# Altium integrated library Connector-SIL-THP.IntLib: 464 symbols (part 2 of 2) (continued)
## SIL15S-2.54 (continued)
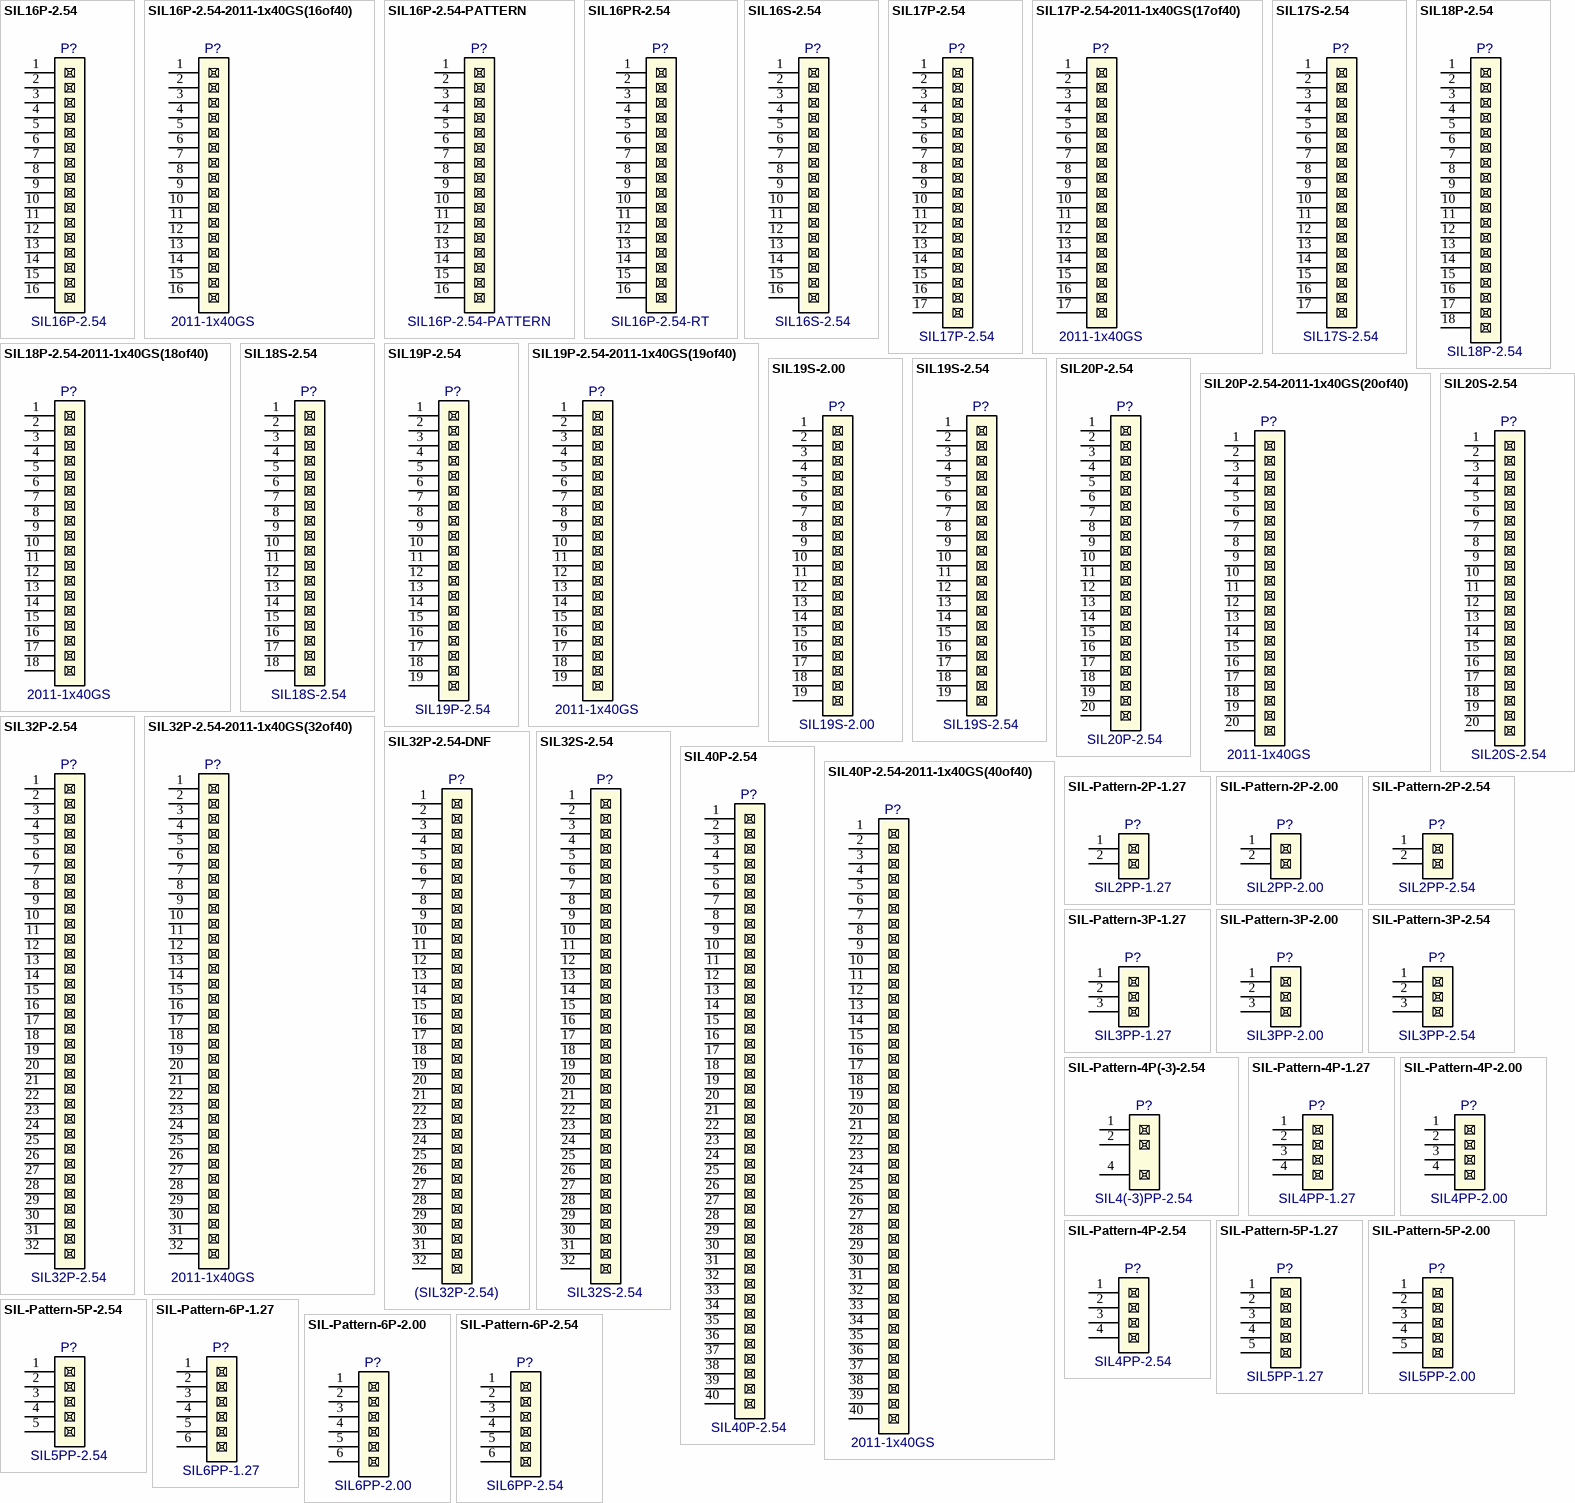
[diagram p9: symbols SIL16P-2.54 to SIL-Pattern-6P-2.54]

## SIL16P-2.54
designator P?, comment Part Number: SIL16P-2.54  (hidden comment: SIL16SP-2.54)
Header SIL Male THP, 2.54mm Pitch; Manufacturer: Various; EDM-PN: CON12; Value: SIL16P-2.54; Package: SIL16P-2.54; Text2: *; Text1: *; SAAB PN: *
footprint SIL16P-2.54 (SIL Strip 2.54mm)
pins: 1, 2, 3, 4, 5, 6, 7, 8, 9, 10, 11, 12, 13, 14, 15, 16

## SIL16P-2.54-2011-1x40GS(16of40)
designator P?, comment value 2011-1x40GS  (hidden comment: 2011-1x40GS(16of40))
Header SIL Male THP, 2.54mm Pitch; Manufacturer: Protronix; EDM-PN: CON12; Package: SIL16P-2.54; Text2: *; Text1: *; SAAB PN: *; Part Number: 2011-1x40GS(16of40)
footprint SIL16P-2.54 (SIL Strip 2.54mm)
pins: 1, 2, 3, 4, 5, 6, 7, 8, 9, 10, 11, 12, 13, 14, 15, 16

## SIL16P-2.54-PATTERN
designator P?, comment Part Number: SIL16P-2.54-PATTERN  (hidden comment: SIL16SP-2.54-PAttern)  (no BOM)
Header SIL Male THP, 2.54mm Pitch; Manufacturer: Various; Value: SIL16P-2.54-PATTERN; Package: SIL16P-2.54-PATTERN; EDM-PN: *; Text2: *; Text1: *; SAAB PN: *
footprint SIL16P-2.54-Pattern (SIL Strip 2.54mm)
pins: 1, 2, 3, 4, 5, 6, 7, 8, 9, 10, 11, 12, 13, 14, 15, 16

## SIL16PR-2.54
designator P?, comment Part Number: SIL16P-2.54-RT  (hidden comment: SIL16SP-2.54-RT)
Header SIL Male Right Angle THP, 2.54mm Pitch; Manufacturer: Various; Value: SIL16P-2.54-RT; Package: SIL16P-2.54-RT; EDM-PN: *; Text2: *; Text1: *; SAAB PN: *
footprint SIL16P-2.54-RT (SIL16P Rt Angle 2.54mm)
pins: 1, 2, 3, 4, 5, 6, 7, 8, 9, 10, 11, 12, 13, 14, 15, 16

## SIL16S-2.54
designator P?, comment Part Number: SIL16S-2.54  (hidden comment: SIL16SP-2.54)
Header SIL Female THP, 2.54mm Pitch; Manufacturer: Various; Value: SIL16S-2.54; Package: SIL16S-2.54; EDM-PN: *; Text2: *; Text1: *; SAAB PN: *
footprint SIL16S-2.54 (SIL Female 2.54mm)
pins: 1, 2, 3, 4, 5, 6, 7, 8, 9, 10, 11, 12, 13, 14, 15, 16

## SIL17P-2.54
designator P?
Header SIL Male THP, 2.54mm Pitch; Manufacturer: Various; EDM-PN: CON12; Package: SIL17P-2.54; Text2: *; Text1: *; Value: SIL17P-2.54; SAAB PN: *; Part Number: SIL17P-2.54
footprint SIL17P-2.54 (SIL Strip 2.54mm)
pins: 1, 2, 3, 4, 5, 6, 7, 8, 9, 10, 11, 12, 13, 14, 15, 16, 17

## SIL17P-2.54-2011-1x40GS(17of40)
designator P?, comment value 2011-1x40GS  (hidden comment: 2011-1x40GS(17of40))
Header SIL Male THP, 2.54mm Pitch; Manufacturer: Protronix; EDM-PN: CON12; Package: SIL17P-2.54; Text2: *; Text1: *; SAAB PN: *; Part Number: 2011-1x40GS(17of40)
footprint SIL17P-2.54 (SIL Strip 2.54mm)
pins: 1, 2, 3, 4, 5, 6, 7, 8, 9, 10, 11, 12, 13, 14, 15, 16, 17

## SIL17S-2.54
designator P?
Header SIL Female THP, 2.54mm Pitch; Manufacturer: Various; Package: SIL17S-2.54; EDM-PN: *; Text2: *; Text1: *; Value: SIL17S-2.54; Part Number: SIL17S-2.54; SAAB PN: *
footprint SIL17S-2.54 (SIL Female 2.54mm)
pins: 1, 2, 3, 4, 5, 6, 7, 8, 9, 10, 11, 12, 13, 14, 15, 16, 17

## SIL18P-2.54
designator P?
Header SIL Male THP, 2.54mm Pitch; Manufacturer: Various; EDM-PN: CON12; Package: SIL18P-2.54; Text2: *; Text1: *; Value: SIL18P-2.54; SAAB PN: *; Part Number: SIL18P-2.54
footprint SIL18P-2.54 (SIL Strip 2.54mm)
pins: 1, 2, 3, 4, 5, 6, 7, 8, 9, 10, 11, 12, 13, 14, 15, 16, 17, 18

## SIL18P-2.54-2011-1x40GS(18of40)
designator P?, comment value 2011-1x40GS  (hidden comment: 2011-1x40GS(18of40))
Header SIL Male THP, 2.54mm Pitch; Manufacturer: Protronix; EDM-PN: CON12; Package: SIL18P-2.54; Text2: *; Text1: *; SAAB PN: *; Part Number: 2011-1x40GS(18of40)
footprint SIL18P-2.54 (SIL Strip 2.54mm)
pins: 1, 2, 3, 4, 5, 6, 7, 8, 9, 10, 11, 12, 13, 14, 15, 16, 17, 18

## SIL18S-2.54
designator P?
Header SIL Female THP, 2.54mm Pitch; Manufacturer: Various; Package: SIL18S-2.54; EDM-PN: *; Text2: *; Text1: *; Value: SIL18S-2.54; Part Number: SIL18S-2.54; SAAB PN: *
footprint SIL18S-2.54 (SIL Female 2.54mm)
pins: 1, 2, 3, 4, 5, 6, 7, 8, 9, 10, 11, 12, 13, 14, 15, 16, 17, 18

## SIL19P-2.54
designator P?
Header SIL Male THP, 2.54mm Pitch; Manufacturer: Various; EDM-PN: CON12; Package: SIL19P-2.54; Text2: *; Text1: *; Value: SIL19P-2.54; SAAB PN: *; Part Number: SIL19P-2.54
footprint SIL19P-2.54 (SIL Strip 2.54mm)
pins: 1, 2, 3, 4, 5, 6, 7, 8, 9, 10, 11, 12, 13, 14, 15, 16, 17, 18, 19

## SIL19P-2.54-2011-1x40GS(19of40)
designator P?, comment value 2011-1x40GS  (hidden comment: 2011-1x40GS(19of40))
Header SIL Male THP, 2.54mm Pitch; Manufacturer: Protronix; EDM-PN: CON12; Package: SIL19P-2.54; Text2: *; Text1: *; SAAB PN: *; Part Number: 2011-1x40GS(19of40)
footprint SIL19P-2.54 (SIL Strip 2.54mm)
pins: 1, 2, 3, 4, 5, 6, 7, 8, 9, 10, 11, 12, 13, 14, 15, 16, 17, 18, 19

## SIL19S-2.00
designator P?
Header SIL Female THP, 2.00mm Pitch; Manufacturer: Various; Package: SIL19S-2.00; EDM-PN: *; Text2: *; Text1: *; Value: SIL19S-2.00; Part Number: SIL19S-2.00; SAAB PN: *
footprint SIL19S-2.00 (SIL Female 2.00mm)
pins: 1, 2, 3, 4, 5, 6, 7, 8, 9, 10, 11, 12, 13, 14, 15, 16, 17, 18, 19

## SIL19S-2.54
designator P?
Header SIL Female THP, 2.54mm Pitch; Manufacturer: Various; Package: SIL19S-2.54; EDM-PN: *; Text2: *; Text1: *; Value: SIL19S-2.54; Part Number: SIL19S-2.54; SAAB PN: *
footprint SIL19S-2.54 (SIL Female 2.54mm)
pins: 1, 2, 3, 4, 5, 6, 7, 8, 9, 10, 11, 12, 13, 14, 15, 16, 17, 18, 19

## SIL20P-2.54
designator P?
Header SIL Male THP, 2.54mm Pitch; Manufacturer: Various; EDM-PN: CON12; Package: SIL20P-2.54; Text2: *; Text1: *; Value: SIL20P-2.54; SAAB PN: *; Part Number: SIL20P-2.54
footprint SIL20P-2.54 (SIL Strip 2.54mm)
pins: 1, 2, 3, 4, 5, 6, 7, 8, 9, 10, 11, 12, 13, 14, 15, 16, 17, 18, 19, 20

## SIL20P-2.54-2011-1x40GS(20of40)
designator P?, comment value 2011-1x40GS  (hidden comment: 2011-1x40GS(20of40))
Header SIL Male THP, 2.54mm Pitch; Manufacturer: Protronix; EDM-PN: CON12; Package: SIL20P-2.54; Text2: *; Text1: *; SAAB PN: *; Part Number: 2011-1x40GS(20of40)
footprint SIL20P-2.54 (SIL Strip 2.54mm)
pins: 1, 2, 3, 4, 5, 6, 7, 8, 9, 10, 11, 12, 13, 14, 15, 16, 17, 18, 19, 20

## SIL20S-2.54
designator P?
Header SIL Female THP, 2.54mm Pitch; Manufacturer: Various; Package: SIL20S-2.54; EDM-PN: *; Text2: *; Text1: *; Value: SIL20S-2.54; Part Number: SIL20S-2.54; SAAB PN: *
footprint SIL20S-2.54 (SIL Female 2.54mm)
pins: 1, 2, 3, 4, 5, 6, 7, 8, 9, 10, 11, 12, 13, 14, 15, 16, 17, 18, 19, 20

## SIL32P-2.54
designator P?
Header SIL Male THP, 2.54mm Pitch; Manufacturer: Various; EDM-PN: CON12; Package: SIL32P-2.54; Text2: *; Text1: *; Value: SIL32P-2.54; SAAB PN: *; Part Number: SIL32P-2.54
footprint SIL32P-2.54 (SIL Strip 2.54mm)
pins: 1, 2, 3, 4, 5, 6, 7, 8, 9, 10, 11, 12, 13, 14, 15, 16, 17, 18, 19, 20, 21, 22, 23, 24, 25, 26, 27, 28, 29, 30, 31, 32

## SIL32P-2.54-2011-1x40GS(32of40)
designator P?, comment value 2011-1x40GS  (hidden comment: 2011-1x40GS(32of40))
Header SIL Male THP, 2.54mm Pitch; Manufacturer: Protronix; EDM-PN: CON12; Package: SIL32P-2.54; Text2: *; Text1: *; SAAB PN: *; Part Number: 2011-1x40GS(32of40)
footprint SIL32P-2.54 (SIL Strip 2.54mm)
pins: 1, 2, 3, 4, 5, 6, 7, 8, 9, 10, 11, 12, 13, 14, 15, 16, 17, 18, 19, 20, 21, 22, 23, 24, 25, 26, 27, 28, 29, 30, 31, 32

## SIL32P-2.54-DNF
designator P?, comment value (SIL32P-2.54)  (hidden comment: SIL32P-2.54)
Header SIL Male THP, 2.54mm Pitch - Do not Fit; Manufacturer: Various; Part Number: DFN - SIL32P-2.54; EDM-PN: CON12; Package: SIL32P-2.54; Text2: *; Text1: *; SAAB PN: *
footprint SIL32P-2.54 (SIL Strip 2.54mm)
pins: 1, 2, 3, 4, 5, 6, 7, 8, 9, 10, 11, 12, 13, 14, 15, 16, 17, 18, 19, 20, 21, 22, 23, 24, 25, 26, 27, 28, 29, 30, 31, 32

## SIL32S-2.54
designator P?
Header SIL Female THP, 2.54mm Pitch; Manufacturer: Various; Package: SIL32S-2.54; EDM-PN: *; Text2: *; Text1: *; Value: SIL32S-2.54; Part Number: SIL32S-2.54; SAAB PN: *
footprint SIL32S-2.54 (SIL Female 2.54mm)
pins: 1, 2, 3, 4, 5, 6, 7, 8, 9, 10, 11, 12, 13, 14, 15, 16, 17, 18, 19, 20, 21, 22, 23, 24, 25, 26, 27, 28, 29, 30, 31, 32

## SIL40P-2.54
designator P?
Header SIL Male THP, 2.54mm Pitch; Manufacturer: Various; EDM-PN: CON12; Package: SIL40P-2.54; Text2: *; Text1: *; Value: SIL40P-2.54; SAAB PN: *; Part Number: SIL40P-2.54
footprint SIL40P-2.54 (SIL Strip 2.54mm)
pins: 1, 2, 3, 4, 5, 6, 7, 8, 9, 10, 11, 12, 13, 14, 15, 16, 17, 18, 19, 20, 21, 22, 23, 24, 25, 26, 27, 28, 29, 30, 31, 32, 33, 34, 35, 36, 37, 38, 39, 40

## SIL40P-2.54-2011-1x40GS(40of40)
designator P?, comment value 2011-1x40GS  (hidden comment: 2011-1x40GS(40of40))
Header SIL Male THP, 2.54mm Pitch; Manufacturer: Protronix; EDM-PN: CON12; Package: SIL40P-2.54; Text2: *; Text1: *; SAAB PN: *; Part Number: 2011-1x40GS(40of40)
footprint SIL40P-2.54 (SIL Strip 2.54mm)
pins: 1, 2, 3, 4, 5, 6, 7, 8, 9, 10, 11, 12, 13, 14, 15, 16, 17, 18, 19, 20, 21, 22, 23, 24, 25, 26, 27, 28, 29, 30, 31, 32, 33, 34, 35, 36, 37, 38, 39, 40

## SIL-Pattern-2P-1.27
designator P?  Part Number: SIL2PP-1.27  (hidden comment: SIL-Pattern-2P-1.27)  (no BOM)
Header SIL Pattern THP, 1.27mm Pitch; Manufacturer: Various; Value: SIL2PP-1.27; Package: SIL2S-1.27-PATTERN; EDM-PN: *; Text2: *; Text1: *; SAAB PN: *
footprint SIL2S-1.27-PATTERN
pins: 1, 2

## SIL-Pattern-2P-2.00
designator P?  Part Number: SIL2PP-2.00  (hidden comment: SIL-Pattern-2P-2.00)  (no BOM)
Pattern SIL Male THP, 2.00mm Pitch (no Component); Value: SIL2P-2.00-Pattern; Manufacturer: N/A; Package: SIL2P-2.00-Pattern; EDM-PN: *; Text2: *; Text1: *; SAAB PN: *
footprint SIL2P-2.00-PATTERN (SIL2P 4.0x2.0mm)
pins: 1, 2

## SIL-Pattern-2P-2.54
designator P?  Part Number: SIL2PP-2.54  (hidden comment: SIL-Pattern-2P-2.54)  (no BOM)
Pattern SIL Male THP, 2.54mm Pitch (no Component); Value: SIL2P-2.54-Pattern; Manufacturer: N/A; Package: SIL2P-2.54-Pattern; EDM-PN: *; Text2: *; Text1: *; SAAB PN: *
footprint SIL2P-2.54-Pattern (SIL Strip 2.54mm)
pins: 1, 2

## SIL-Pattern-3P-1.27
designator P?  Part Number: SIL3PP-1.27  (hidden comment: SIL-Pattern-3P-1.27)  (no BOM)
Header SIL Pattern THP, 1.27mm Pitch; Manufacturer: Various; Value: SIL3PP-1.27; Package: SIL3S-1.27-PATTERN; EDM-PN: *; Text2: *; Text1: *; SAAB PN: *
footprint SIL3S-1.27-PATTERN
pins: 1, 2, 3

## SIL-Pattern-3P-2.00
designator P?  Part Number: SIL3PP-2.00  (hidden comment: SIL-Pattern-3P-2.00)  (no BOM)
Pattern SIL Male THP, 2.00mm Pitch (no Component); Value: SIL3P-2.00-Pattern; Manufacturer: N/A; Package: SIL3P-2.00-Pattern; EDM-PN: *; Text2: *; Text1: *; SAAB PN: *
footprint SIL3P-2.00-PATTERN (SIL3P 6.0x2.0mm)
pins: 1, 2, 3

## SIL-Pattern-3P-2.54
designator P?  Part Number: SIL3PP-2.54  (hidden comment: SIL-Pattern-3P-2.54)  (no BOM)
Pattern SIL Male THP, 2.54mm Pitch (no Component); Value: SIL3P-2.54-Pattern; Manufacturer: N/A; Package: SIL3P-2.54-Pattern; EDM-PN: *; Text2: *; Text1: *; SAAB PN: *
footprint SIL3P-2.54-Pattern (SIL Strip 2.54mm)
pins: 1, 2, 3

## SIL-Pattern-4P(-3)-2.54
designator P?  Part Number: SIL4(-3)PP-2.54  (hidden comment: SIL-Pattern-4P(-3)-2.54)  (no BOM)
Pattern SIL Male THP, 2.54mm Pitch (no Component); Value: SIL4(-3)P-2.54-Pattern; Manufacturer: N/A; Package: SIL4P(-3)-2.54-Pattern; EDM-PN: *; Text2: *; Text1: *; SAAB PN: *
footprint SIL4P(-3)-2.54-Pattern (SIL Strip 2.54mm)
pins: 1, 2, 4

## SIL-Pattern-4P-1.27
designator P?  Part Number: SIL4PP-1.27  (hidden comment: SIL-Pattern-4P-1.27)  (no BOM)
Header SIL Pattern THP, 1.27mm Pitch; Manufacturer: Various; Value: SIL4PP-1.27; Package: SIL4S-1.27-PATTERN; EDM-PN: *; Text2: *; Text1: *; SAAB PN: *
footprint SIL4S-1.27-PATTERN
pins: 1, 2, 3, 4

## SIL-Pattern-4P-2.00
designator P?  Part Number: SIL4PP-2.00  (hidden comment: SIL-Pattern-4P-2.00)  (no BOM)
Pattern SIL Male THP, 2.00mm Pitch (no Component); Value: SIL4P-2.00-Pattern; Manufacturer: N/A; Package: SIL4P-2.00-Pattern; EDM-PN: *; Text2: *; Text1: *; SAAB PN: *
footprint SIL4P-2.00-PATTERN (SIL4P 8.0x2.0mm)
pins: 1, 2, 3, 4

## SIL-Pattern-4P-2.54
designator P?  Part Number: SIL4PP-2.54  (hidden comment: SIL-Pattern-4P-2.54)  (no BOM)
Pattern SIL Male THP, 2.54mm Pitch (no Component); Value: SIL4P-2.54-Pattern; Manufacturer: N/A; Package: SIL4P-2.54-Pattern; EDM-PN: *; Text2: *; Text1: *; SAAB PN: *
footprint SIL4P-2.54-Pattern (SIL Strip 2.54mm)
pins: 1, 2, 3, 4

## SIL-Pattern-5P-1.27
designator P?  Part Number: SIL5PP-1.27  (hidden comment: SIL-Pattern-5P-1.27)  (no BOM)
Header SIL Pattern THP, 1.27mm Pitch; Manufacturer: Various; Value: SIL5PP-1.27; Package: SIL5S-1.27-PATTERN; EDM-PN: *; Text2: *; Text1: *; SAAB PN: *
footprint SIL5S-1.27-PATTERN
pins: 1, 2, 3, 4, 5

## SIL-Pattern-5P-2.00
designator P?  Part Number: SIL5PP-2.00  (hidden comment: SIL-Pattern-5P-2.00)  (no BOM)
Pattern SIL Male THP, 2.00mm Pitch (no Component); Value: SIL5P-2.00-Pattern; Manufacturer: N/A; Package: SIL5P-2.00-Pattern; EDM-PN: *; Text2: *; Text1: *; SAAB PN: *
footprint SIL5P-2.00-PATTERN (SIL5P 10.0x2.0mm)
pins: 1, 2, 3, 4, 5

## SIL-Pattern-5P-2.54
designator P?  Part Number: SIL5PP-2.54  (hidden comment: SIL-Pattern-5P-2.54)  (no BOM)
Pattern SIL Male THP, 2.54mm Pitch (no Component); Value: SIL5P-2.54-Pattern; Manufacturer: N/A; Package: SIL5P-2.54-Pattern; EDM-PN: *; Text2: *; Text1: *; SAAB PN: *
footprint SIL5P-2.54-Pattern (SIL Strip 2.54mm)
pins: 1, 2, 3, 4, 5

## SIL-Pattern-6P-1.27
designator P?  Part Number: SIL6PP-1.27  (hidden comment: SIL-Pattern-6P-1.27)  (no BOM)
Header SIL Pattern THP, 1.27mm Pitch; Manufacturer: Various; Value: SIL6PP-1.27; Package: SIL6S-1.27-PATTERN; EDM-PN: *; Text2: *; Text1: *; SAAB PN: *
footprint SIL6S-1.27-PATTERN
pins: 1, 2, 3, 4, 5, 6

## SIL-Pattern-6P-2.00
designator P?  Part Number: SIL6PP-2.00  (hidden comment: SIL-Pattern-6P-2.00)  (no BOM)
Pattern SIL Male THP, 2.00mm Pitch (no Component); Value: SIL6P-2.00-Pattern; Manufacturer: N/A; Package: SIL6P-2.00-Pattern; EDM-PN: *; Text2: *; Text1: *; SAAB PN: *
footprint SIL6P-2.00-PATTERN (SIL6P 12.0x2.0mm)
pins: 1, 2, 3, 4, 5, 6

## SIL-Pattern-6P-2.54
designator P?  Part Number: SIL6PP-2.54  (hidden comment: SIL-Pattern-6P-2.54)  (no BOM)
Pattern SIL Male THP, 2.54mm Pitch (no Component); Value: SIL6P-2.54-Pattern; Manufacturer: N/A; Package: SIL6P-2.54-Pattern; EDM-PN: *; Text2: *; Text1: *; SAAB PN: *
footprint SIL6P-2.54-Pattern (SIL Strip 2.54mm)
pins: 1, 2, 3, 4, 5, 6

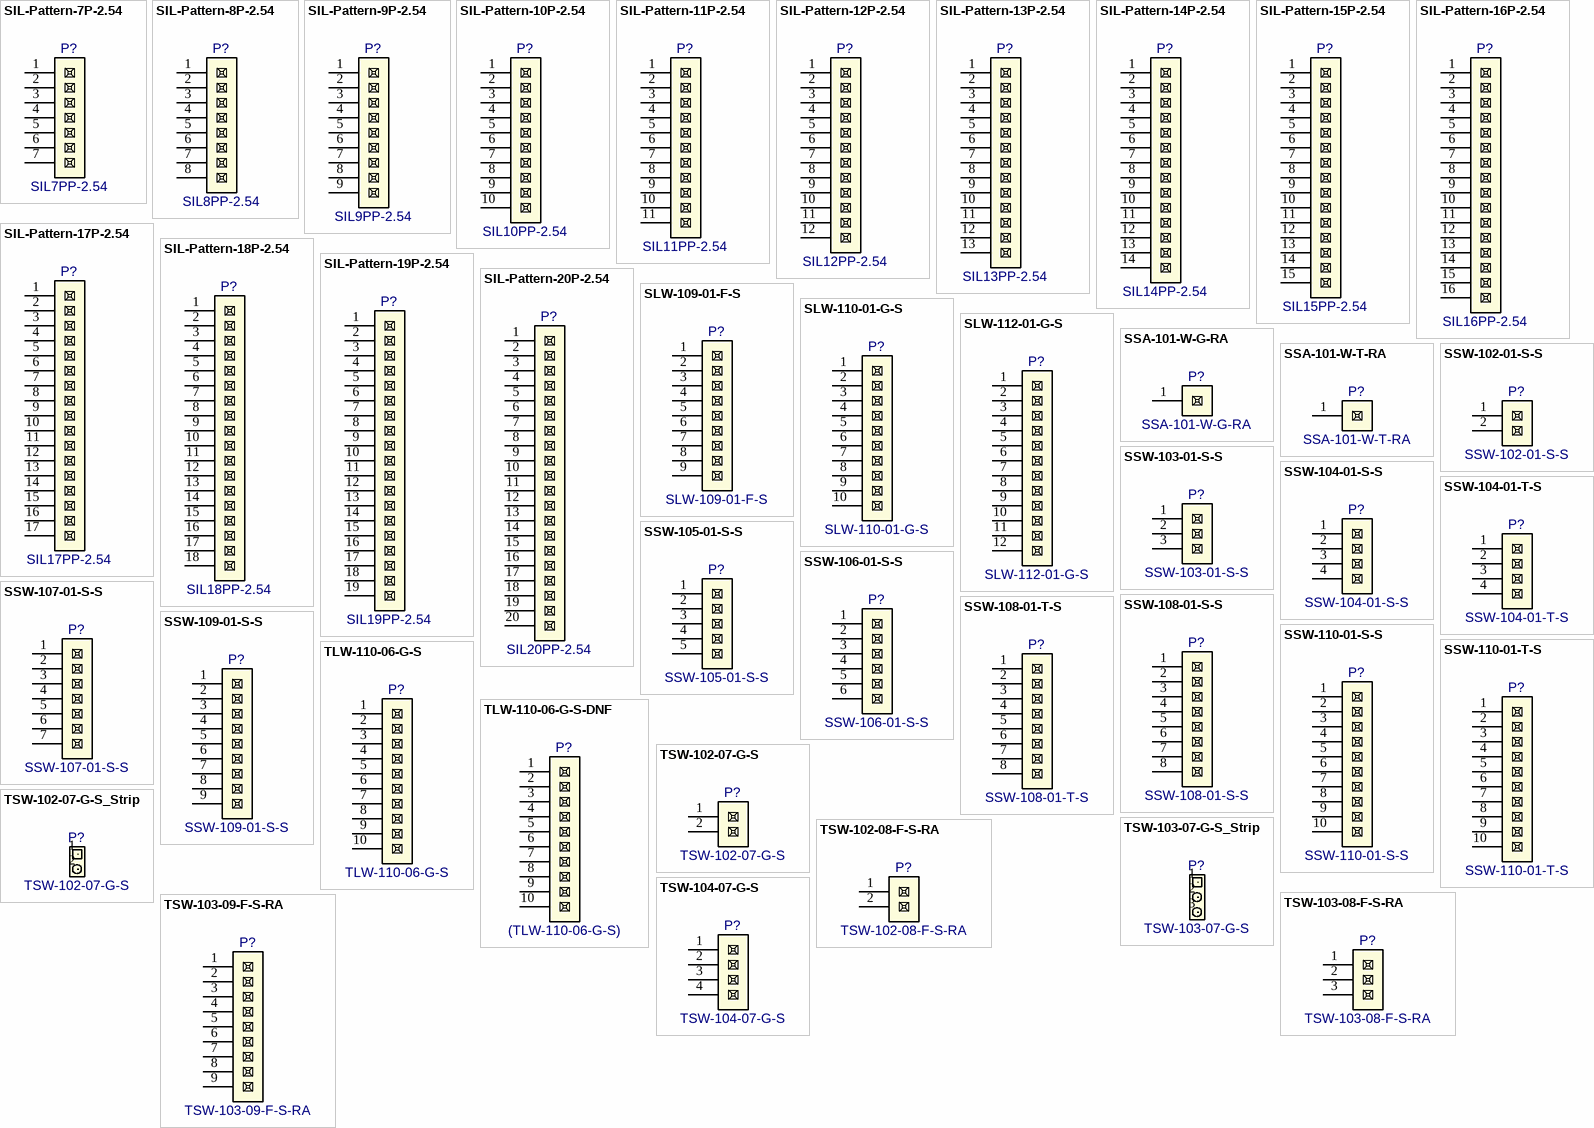
[diagram p10: symbols SIL-Pattern-7P-2.54 to TSW-104-07-G-S]

## SIL-Pattern-7P-2.54
designator P?  Part Number: SIL7PP-2.54  (hidden comment: SIL-Pattern-7P-2.54)  (no BOM)
Pattern SIL Male THP, 2.54mm Pitch (no Component); Value: SIL7P-2.54-Pattern; Manufacturer: N/A; Package: SIL7P-2.54-Pattern; EDM-PN: *; Text2: *; Text1: *; SAAB PN: *
footprint SIL7P-2.54-Pattern (SIL Strip 2.54mm)
pins: 1, 2, 3, 4, 5, 6, 7

## SIL-Pattern-8P-2.54
designator P?  Part Number: SIL8PP-2.54  (hidden comment: SIL-Pattern-8P-2.54)  (no BOM)
Pattern SIL Male THP, 2.54mm Pitch (no Component); Value: SIL8P-2.54-Pattern; Manufacturer: N/A; Package: SIL8P-2.54-Pattern; EDM-PN: *; Text2: *; Text1: *; SAAB PN: *
footprint SIL8P-2.54-Pattern (SIL Strip 2.54mm)
pins: 1, 2, 3, 4, 5, 6, 7, 8

## SIL-Pattern-9P-2.54
designator P?  Part Number: SIL9PP-2.54  (hidden comment: SIL-Pattern-9P-2.54)  (no BOM)
Pattern SIL Male THP, 2.54mm Pitch (no Component); Value: SIL9P-2.54-Pattern; Manufacturer: N/A; Package: SIL9P-2.54-Pattern; EDM-PN: *; Text2: *; Text1: *; SAAB PN: *
footprint SIL9P-2.54-Pattern (SIL Strip 2.54mm)
pins: 1, 2, 3, 4, 5, 6, 7, 8, 9

## SIL-Pattern-10P-2.54
designator P?  Part Number: SIL10PP-2.54  (hidden comment: SIL-Pattern-10P-2.54)  (no BOM)
Pattern SIL Male THP, 2.54mm Pitch (no Component); Value: SIL10P-2.54-Pattern; Manufacturer: N/A; Package: SIL10P-2.54-Pattern; EDM-PN: *; Text2: *; Text1: *; SAAB PN: *
footprint SIL10P-2.54-Pattern (SIL Strip 2.54mm)
pins: 1, 2, 3, 4, 5, 6, 7, 8, 9, 10

## SIL-Pattern-11P-2.54
designator P?  Part Number: SIL11PP-2.54  (hidden comment: SIL-Pattern-11P-2.54)  (no BOM)
Pattern SIL Male THP, 2.54mm Pitch (no Component); Value: SIL11P-2.54-Pattern; Manufacturer: N/A; Package: SIL11P-2.54-Pattern; EDM-PN: *; Text2: *; Text1: *; SAAB PN: *
footprint SIL11P-2.54-Pattern (SIL Strip 2.54mm)
pins: 1, 2, 3, 4, 5, 6, 7, 8, 9, 10, 11

## SIL-Pattern-12P-2.54
designator P?  Part Number: SIL12PP-2.54  (hidden comment: SIL-Pattern-12P-2.54)  (no BOM)
Pattern SIL Male THP, 2.54mm Pitch (no Component); Value: SIL12P-2.54-Pattern; Manufacturer: N/A; Package: SIL12P-2.54-Pattern; EDM-PN: *; Text2: *; Text1: *; SAAB PN: *
footprint SIL12P-2.54-Pattern (SIL Strip 2.54mm)
pins: 1, 2, 3, 4, 5, 6, 7, 8, 9, 10, 11, 12

## SIL-Pattern-13P-2.54
designator P?  Part Number: SIL13PP-2.54  (hidden comment: SIL-Pattern-13P-2.54)  (no BOM)
Pattern SIL Male THP, 2.54mm Pitch (no Component); Value: SIL13P-2.54-Pattern; Manufacturer: N/A; Package: SIL13P-2.54-Pattern; EDM-PN: *; Text2: *; Text1: *; SAAB PN: *
footprint SIL13P-2.54-Pattern (SIL Strip 2.54mm)
pins: 1, 2, 3, 4, 5, 6, 7, 8, 9, 10, 11, 12, 13

## SIL-Pattern-14P-2.54
designator P?  Part Number: SIL14PP-2.54  (hidden comment: SIL-Pattern-14P-2.54)  (no BOM)
Pattern SIL Male THP, 2.54mm Pitch (no Component); Value: SIL14P-2.54-Pattern; Manufacturer: N/A; Package: SIL14P-2.54-Pattern; EDM-PN: *; Text2: *; Text1: *; SAAB PN: *
footprint SIL14P-2.54-Pattern (SIL Strip 2.54mm)
pins: 1, 2, 3, 4, 5, 6, 7, 8, 9, 10, 11, 12, 13, 14

## SIL-Pattern-15P-2.54
designator P?  Part Number: SIL15PP-2.54  (hidden comment: SIL-Pattern-15P-2.54)  (no BOM)
Pattern SIL Male THP, 2.54mm Pitch (no Component); Value: SIL15P-2.54-Pattern; Manufacturer: N/A; Package: SIL15P-2.54-Pattern; EDM-PN: *; Text2: *; Text1: *; SAAB PN: *
footprint SIL15P-2.54-Pattern (SIL Strip 2.54mm)
pins: 1, 2, 3, 4, 5, 6, 7, 8, 9, 10, 11, 12, 13, 14, 15

## SIL-Pattern-16P-2.54
designator P?  Part Number: SIL16PP-2.54  (hidden comment: SIL-Pattern-16P-2.54)  (no BOM)
Pattern SIL Male THP, 2.54mm Pitch (no Component); Value: SIL16P-2.54-Pattern; Manufacturer: N/A; Package: SIL16P-2.54-Pattern; EDM-PN: *; Text2: *; Text1: *; SAAB PN: *
footprint SIL16P-2.54-Pattern (SIL Strip 2.54mm)
pins: 1, 2, 3, 4, 5, 6, 7, 8, 9, 10, 11, 12, 13, 14, 15, 16

## SIL-Pattern-17P-2.54
designator P?  Part Number: SIL17PP-2.54  (hidden comment: SIL-Pattern-17P-2.54)  (no BOM)
Pattern SIL Male THP, 2.54mm Pitch (no Component); Value: SIL17P-2.54-Pattern; Manufacturer: N/A; Package: SIL17P-2.54-Pattern; EDM-PN: *; Text2: *; Text1: *; SAAB PN: *
footprint SIL17P-2.54-Pattern (SIL Strip 2.54mm)
pins: 1, 2, 3, 4, 5, 6, 7, 8, 9, 10, 11, 12, 13, 14, 15, 16, 17

## SIL-Pattern-18P-2.54
designator P?  Part Number: SIL18PP-2.54  (hidden comment: SIL-Pattern-18P-2.54)  (no BOM)
Pattern SIL Male THP, 2.54mm Pitch (no Component); Value: SIL18P-2.54-Pattern; Manufacturer: N/A; Package: SIL18P-2.54-Pattern; EDM-PN: *; Text2: *; Text1: *; SAAB PN: *
footprint SIL18P-2.54-Pattern (SIL Strip 2.54mm)
pins: 1, 2, 3, 4, 5, 6, 7, 8, 9, 10, 11, 12, 13, 14, 15, 16, 17, 18

## SIL-Pattern-19P-2.54
designator P?  Part Number: SIL19PP-2.54  (hidden comment: SIL-Pattern-19P-2.54)  (no BOM)
Pattern SIL Male THP, 2.54mm Pitch (no Component); Value: SIL19P-2.54-Pattern; Manufacturer: N/A; Package: SIL19P-2.54-Pattern; EDM-PN: *; Text2: *; Text1: *; SAAB PN: *
footprint SIL19P-2.54-Pattern (SIL Strip 2.54mm)
pins: 1, 2, 3, 4, 5, 6, 7, 8, 9, 10, 11, 12, 13, 14, 15, 16, 17, 18, 19

## SIL-Pattern-20P-2.54
designator P?  Part Number: SIL20PP-2.54  (hidden comment: SIL-Pattern-20P-2.54)  (no BOM)
Pattern SIL Male THP, 2.54mm Pitch (no Component); Value: SIL20P-2.54-Pattern; Manufacturer: N/A; Package: SIL20P-2.54-Pattern; EDM-PN: *; Text2: *; Text1: *; SAAB PN: *
footprint SIL20P-2.54-Pattern (SIL Strip 2.54mm)
pins: 1, 2, 3, 4, 5, 6, 7, 8, 9, 10, 11, 12, 13, 14, 15, 16, 17, 18, 19, 20

## SLW-109-01-F-S
designator P?
Socket SIL Female THP, 2.54mm Pitch; Manufacturer: Samtec; Package: SLW-109-01-F-S; EDM-PN: *; Text2: *; Text1: *; Value: SLW-109-01-F-S; SAAB PN: *; Part Number: SLW-109-01-F-S
footprint SLW-109-01-F-S
pins: 1, 2, 3, 4, 5, 6, 7, 8, 9

## SLW-110-01-G-S
designator P?
Socket SIL Female THP, 2.54mm Pitch; Manufacturer: Samtec; Package: SLW-110-01-X-S; EDM-PN: *; Text2: *; Text1: *; Value: SLW-110-01-G-S; SAAB PN: *; Part Number: SLW-110-01-G-S
footprint SLW-110-01-X-S (SIL Strip Low Profile 2.54mm)
pins: 1, 2, 3, 4, 5, 6, 7, 8, 9, 10

## SLW-112-01-G-S
designator P?
Socket SIL Female THP, 2.54mm Pitch; Manufacturer: Samtec; Package: SLW-112-01-X-S; EDM-PN: *; Text2: *; Text1: *; Value: SLW-112-01-G-S; Part Number: SLW-112-01-G-S; SAAB PN: *
footprint SLW-112-01-X-S (SIL Strip Low Profile 2.54mm)
pins: 1, 2, 3, 4, 5, 6, 7, 8, 9, 10, 11, 12

## SSA-101-W-G-RA
designator P?
Header SIL Female THP, 2.54mm Pitch Rt Angle; Manufacturer: Samtec; Package: SSA-101-W-T-RA; EDM-PN: *; Text2: *; Text1: *; Value: SSA-101-W-G-RA; SAAB PN: *; Part Number: SSA-101-W-G-RA
footprint SSA-101-W-T-RA
pins: 1

## SSA-101-W-T-RA
designator P?
Header SIL Female THP, 2.54mm Pitch Rt Angle; Manufacturer: Samtec; Package: SSA-101-W-T-RA; EDM-PN: *; Text2: *; Text1: *; Value: SSA-101-W-T-RA; Part Number: SSA-101-W-T-RA; SAAB PN: *
footprint SSA-101-W-T-RA
pins: 1

## SSW-102-01-S-S
designator P?
Header SIL Female THP, 2.54mm Pitch; Manufacturer: Samtec; EDM-PN: CON1629; Package: SSW-102-01-S-S; Text2: *; Text1: *; Value: SSW-102-01-S-S; SAAB PN: *; Part Number: SSW-102-01-S-S
footprint SSW-102-01-S-S (SIL SSW-102-01-S-S)
pins: 1, 2

## SSW-103-01-S-S
designator P?
Header SIL Female THP, 2.54mm Pitch; Manufacturer: Samtec; Package: SSW-103-01-S-S; EDM-PN: *; Text2: *; Text1: *; Value: SSW-103-01-S-S; SAAB PN: *; Part Number: SSW-103-01-S-S
footprint SSW-103-01-S-S (SIL SSW-103-01-S-S)
pins: 1, 2, 3

## SSW-104-01-S-S
designator P?
Header SIL Female THP, 2.54mm Pitch; Manufacturer: Samtec; Package: SSW-104-01-S-S; EDM-PN: *; Text2: *; Text1: *; Value: SSW-104-01-S-S; SAAB PN: *; Part Number: SSW-104-01-S-S
footprint SSW-104-01-S-S (SIL SSW-104-01-S-S)
pins: 1, 2, 3, 4

## SSW-104-01-T-S
designator P?
Header SIL Female THP, 2.54mm Pitch; Manufacturer: Samtec; EDM-PN: CON1828; Package: SSW-104-01-S-S; Text2: *; Text1: *; Value: SSW-104-01-T-S; SAAB PN: *; Part Number: SSW-104-01-T-S
footprint SSW-104-01-S-S (SIL SSW-104-01-S-S)
pins: 1, 2, 3, 4

## SSW-105-01-S-S
designator P?
Header SIL Female THP, 2.54mm Pitch; Manufacturer: Samtec; Package: SSW-105-01-S-S; EDM-PN: *; Text2: *; Text1: *; Value: SSW-105-01-S-S; SAAB PN: *; Part Number: SSW-105-01-S-S
footprint SSW-105-01-S-S (SIL SSW-105-01-S-S)
pins: 1, 2, 3, 4, 5

## SSW-106-01-S-S
designator P?
Header SIL Female THP, 2.54mm Pitch; Manufacturer: Samtec; EDM-PN: CON1802; Package: SSW-106-01-S-S; Text2: *; Text1: *; Value: SSW-106-01-S-S; SAAB PN: *; Part Number: SSW-106-01-S-S
footprint SSW-106-01-S-S (SIL SSW-106-01-S-S)
pins: 1, 2, 3, 4, 5, 6

## SSW-107-01-S-S
designator P?
Header SIL Female THP, 2.54mm Pitch; Manufacturer: Samtec; Package: SSW-107-01-S-S; EDM-PN: *; Text2: *; Text1: *; Value: SSW-107-01-S-S; Part Number: SSW-107-01-S-S; SAAB PN: *
footprint SSW-107-01-S-S (SIL SSW-107-01-S-S)
pins: 1, 2, 3, 4, 5, 6, 7

## SSW-108-01-S-S
designator P?
Header SIL Female THP, 2.54mm Pitch; Manufacturer: Samtec; EDM-PN: CON1803; Package: SSW-108-01-S-S; Text2: *; Text1: *; Value: SSW-108-01-S-S; SAAB PN: *; Part Number: SSW-108-01-S-S
footprint SSW-108-01-S-S (SIL SSW-108-01-S-S)
pins: 1, 2, 3, 4, 5, 6, 7, 8

## SSW-108-01-T-S
designator P?
Header SIL Female THP, 2.54mm Pitch; Manufacturer: Samtec; EDM-PN: CON1576; Package: SSW-108-01-S-S; Text2: *; Text1: *; Value: SSW-108-01-T-S; SAAB PN: *; Part Number: SSW-108-01-T-S
footprint SSW-108-01-S-S (SIL SSW-108-01-S-S)
pins: 1, 2, 3, 4, 5, 6, 7, 8

## SSW-109-01-S-S
designator P?
Header SIL Female THP, 2.54mm Pitch; Manufacturer: Samtec; Package: SSW-109-01-S-S; EDM-PN: *; Text2: *; Text1: *; Value: SSW-109-01-S-S; SAAB PN: *; Part Number: SSW-109-01-S-S
footprint SSW-109-01-S-S (SIL SSW-109-01-S-S)
pins: 1, 2, 3, 4, 5, 6, 7, 8, 9

## SSW-110-01-S-S
designator P?
Header SIL Female THP, 2.54mm Pitch; Manufacturer: Samtec; EDM-PN: CON1625; Package: SSW-110-01-S-S; Text2: *; Text1: *; Value: SSW-110-01-S-S; SAAB PN: *; Part Number: SSW-110-01-S-S
footprint SSW-110-01-S-S (SIL SSW-110-01-S-S)
pins: 1, 2, 3, 4, 5, 6, 7, 8, 9, 10

## SSW-110-01-T-S
designator P?
Header SIL Female THP, 2.54mm Pitch; Manufacturer: Samtec; EDM-PN: CON1577; Package: SSW-110-01-S-S; Text2: *; Text1: *; Value: SSW-110-01-T-S; SAAB PN: *; Part Number: SSW-110-01-T-S
footprint SSW-110-01-S-S (SIL SSW-110-01-S-S)
pins: 1, 2, 3, 4, 5, 6, 7, 8, 9, 10

## TLW-110-06-G-S
designator P?
Header SIL Male THP, 2.54mm Pitch; Manufacturer: Samtec; Package: TLW-110-06-G-S; EDM-PN: *; Text2: *; Text1: *; Value: TLW-110-06-G-S; SAAB PN: *; Part Number: TLW-110-06-G-S
footprint TLW-110-06-G-S (SIL Strip Low Profile 2.54mm)
pins: 1, 2, 3, 4, 5, 6, 7, 8, 9, 10

## TLW-110-06-G-S-DNF
designator P?  value (TLW-110-06-G-S)  (hidden comment: TLW-110-06-G-S-DNF)
Header SIL Male THP, 2.54mm Pitch - Do not Fit; Manufacturer: Samtec; Part Number: DNF - TLW-110-06-G-S; Package: TLW-110-06-G-S; EDM-PN: *; Text2: *; Text1: *; SAAB PN: *
footprint TLW-110-06-G-S (SIL Strip Low Profile 2.54mm)
pins: 1, 2, 3, 4, 5, 6, 7, 8, 9, 10

## TSW-102-07-G-S
designator P?
Header SIL Male THP, 2.54mm Pitch; Manufacturer: Samtec; EDM-PN: CON12; Package: SIL2P-2.54; Text2: *; Text1: *; Value: TSW-102-07-G-S; SAAB PN: *; Part Number: TSW-102-07-G-S
footprint SIL2P-2.54 (SIL Strip 2.54mm)
pins: 1, 2

## TSW-102-07-G-S_Strip
designator P?, comment TSW-102-07-G-S
Header SIL Male THP, 2.54mm Pitch; Manufacturer: Samtec; EDM-PN: CON12; Package: SIL2P-2.54; Text2: *; Text1: *; Value: TSW-102-07-G-S; SAAB PN: *; Part Number: TSW-102-07-G-S
footprint SIL2P-2.54 (SIL Strip 2.54mm)
pins: 1, 2

## TSW-102-08-F-S-RA
designator P?
Header SIL Male 2.54mm Rt Angle; Manufacturer: Samtec; Package: SIL2PR-2.54; EDM-PN: *; Text2: *; Text1: *; Part Number: TSW-102-08-F-S-RA; SAAB PN: *; Value: TSW-102-08-F-S-RA
footprint SIL2PR-2.54 (SIL Male Rt Angle THP Header, 2.54mm Pitch)
pins: 1, 2

## TSW-103-07-G-S_Strip
designator P?, comment TSW-103-07-G-S
Header SIL Male THP, 2.54mm Pitch; Manufacturer: Samtec; EDM-PN: CON12; Package: SIL3P-2.54; Text2: *; Text1: *; Value: TSW-103-07-G-S; SAAB PN: *; Part Number: TSW-103-07-G-S
footprint SIL3P-2.54 (SIL Strip 2.54mm)
pins: 1, 2, 3

## TSW-103-08-F-S-RA
designator P?
Header SIL Male 2.54mm Rt Angle; Manufacturer: Samtec; Package: SIL3PR-2.54; EDM-PN: *; Text2: *; Text1: *; Part Number: TSW-103-08-F-S-RA; Value: TSW-103-08-F-S-RA; SAAB PN: *
footprint SIL3PR-2.54 (SIL Male Rt Angle THP Header, 2.54mm Pitch)
pins: 1, 2, 3

## TSW-103-09-F-S-RA
designator P?
Header SIL Male 2.54mm Rt Angle; Manufacturer: Samtec; Package: SIL9PR-2.54; EDM-PN: *; Text2: *; Text1: *; Part Number: TSW-103-09-F-S-RA; Value: TSW-103-09-F-S-RA; SAAB PN: *
footprint SIL9PR-2.54 (SIL Male Rt Angle THP Header, 2.54mm Pitch)
pins: 1, 2, 3, 4, 5, 6, 7, 8, 9

## TSW-104-07-G-S
designator P?
Header SIL Male THP, 2.54mm Pitch; Manufacturer: Samtec; EDM-PN: CON12; Package: SIL4P-2.54; Text2: *; Text1: *; Part Number: TSW-104-07-G-S; SAAB PN: *; Value: TSW-104-07-G-S
footprint SIL4P-2.54 (SIL Strip 2.54mm)
pins: 1, 2, 3, 4

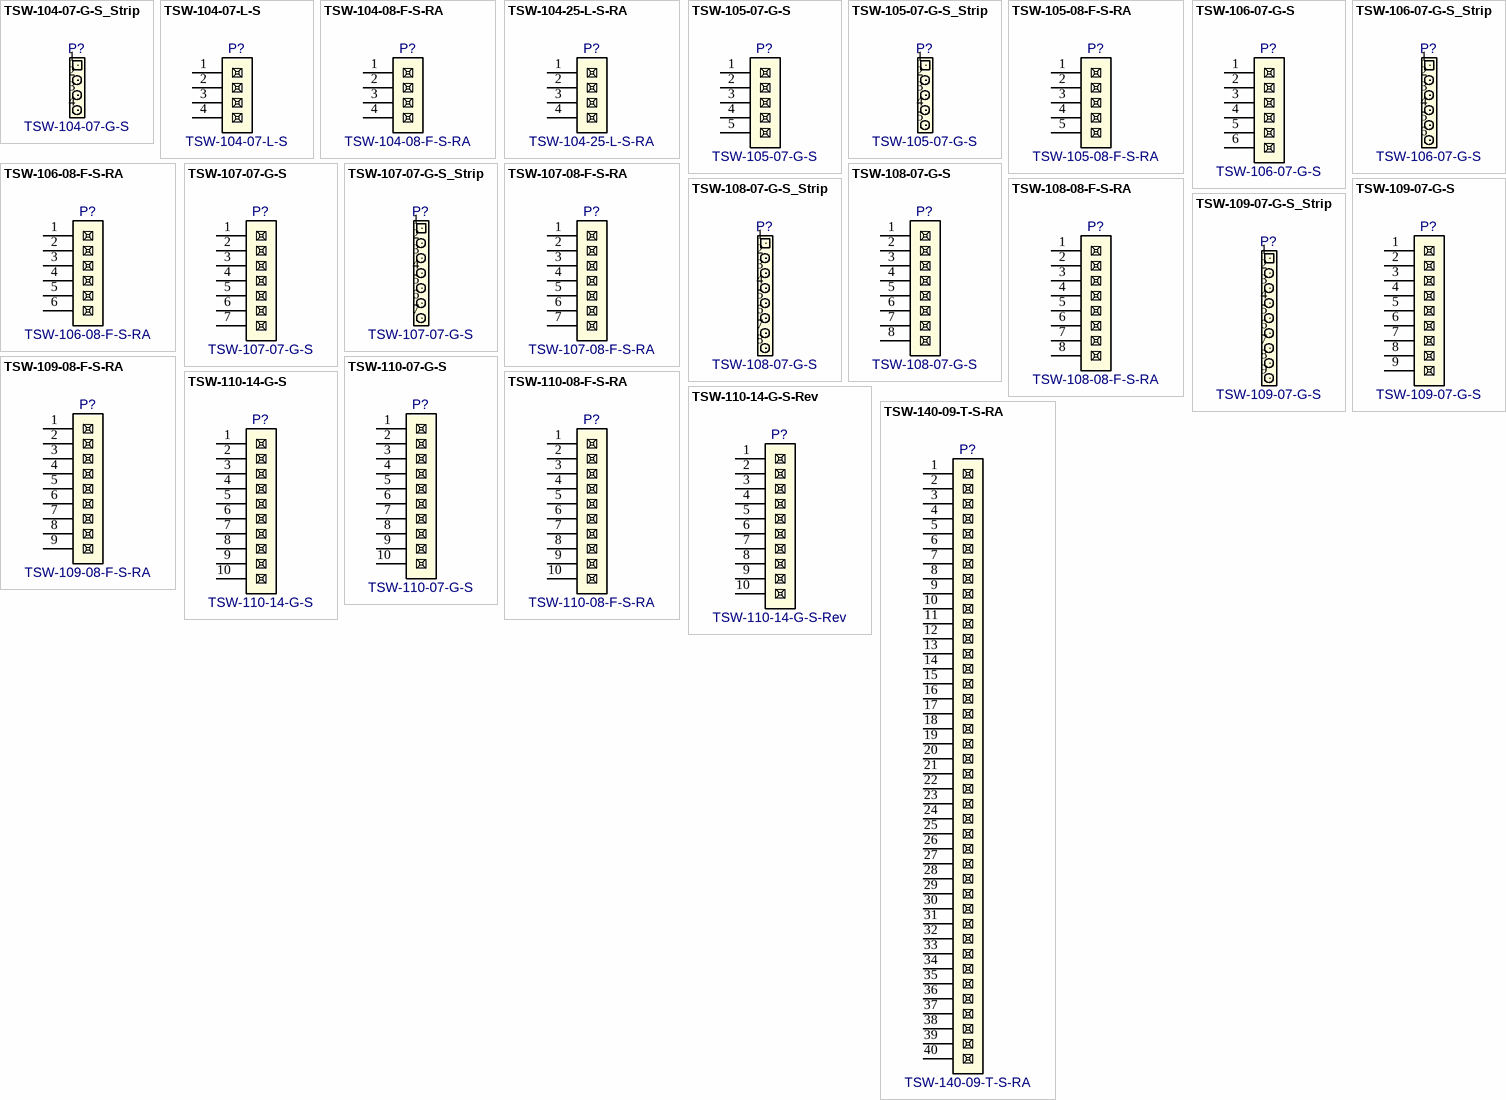
[diagram p11: symbols TSW-104-07-G-S_Strip to TSW-140-09-T-S-RA]

## TSW-104-07-G-S_Strip
designator P?, comment TSW-104-07-G-S
Header SIL Male THP, 2.54mm Pitch; Manufacturer: Samtec; EDM-PN: CON12; Package: SIL4P-2.54; Text2: *; Text1: *; Part Number: TSW-104-07-G-S; SAAB PN: *; Value: TSW-104-07-G-S
footprint SIL4P-2.54 (SIL Strip 2.54mm)
pins: 1, 2, 3, 4

## TSW-104-07-L-S
designator P?
Header SIL Male 2.54mm; Manufacturer: Samtec; Package: TSW-104-07-L-S; EDM-PN: *; Text2: *; Text1: *; Part Number: TSW-104-07-L-S; SAAB PN: *; Value: TSW-104-07-L-S
footprint TSW-104-07-L-S (TSW-104-07-L-S 2.54mm)
pins: 1, 2, 3, 4

## TSW-104-08-F-S-RA
designator P?
Header SIL Male 2.54mm Rt Angle; Manufacturer: Samtec; Package: SIL4PR-2.54; EDM-PN: *; Text2: *; Text1: *; Part Number: TSW-104-08-F-S-RA; SAAB PN: *; Value: TSW-104-08-F-S-RA
footprint SIL4PR-2.54 (SIL Male Rt Angle THP Header, 2.54mm Pitch)
pins: 1, 2, 3, 4

## TSW-104-25-L-S-RA
designator P?
Header SIL Male 2.54mm Rt Angle; Manufacturer: Samtec; Package: TSW-104-25-L-S-RA; EDM-PN: *; Text2: *; Text1: *; Value: TSW-104-25-L-S-RA; Part Number: TSW-104-25-L-S-RA; SAAB PN: *
footprint TSW-104-25-L-S-RA (SIL Male Rt Angle THP Header, 2.54mm Pitch)
pins: 1, 2, 3, 4

## TSW-105-07-G-S
designator P?
Header SIL Male THP, 2.54mm Pitch; Manufacturer: Samtec; EDM-PN: CON12; Package: TSW-105-07-G-S; Text2: *; Text1: *; Value: TSW-105-07-G-S; SAAB PN: *; Part Number: TSW-105-07-G-S
footprint SIL5P-2.54 (SIL Strip 2.54mm)
pins: 1, 2, 3, 4, 5

## TSW-105-07-G-S_Strip
designator P?, comment TSW-105-07-G-S
Header SIL Male THP, 2.54mm Pitch; Manufacturer: Samtec; EDM-PN: CON12; Package: TSW-105-07-G-S; Text2: *; Text1: *; Value: TSW-105-07-G-S; SAAB PN: *; Part Number: TSW-105-07-G-S
footprint SIL5P-2.54 (SIL Strip 2.54mm)
pins: 1, 2, 3, 4, 5

## TSW-105-08-F-S-RA
designator P?
Header SIL Male 2.54mm Rt Angle; Manufacturer: Samtec; Package: SIL5PR-2.54; EDM-PN: *; Text2: *; Text1: *; Part Number: TSW-105-08-F-S-RA; SAAB PN: *; Value: TSW-105-08-F-S-RA
footprint SIL5PR-2.54 (SIL Male Rt Angle THP Header, 2.54mm Pitch)
pins: 1, 2, 3, 4, 5

## TSW-106-07-G-S
designator P?
Header SIL Male THP, 2.54mm Pitch; Manufacturer: Samtec; EDM-PN: CON12; Package: TSW-106-07-G-S; Text2: *; Text1: *; Value: TSW-106-07-G-S; SAAB PN: *; Part Number: TSW-106-07-G-S
footprint TSW-106-07-G-S (TSW-106-07-G-S 2.54mm)
pins: 1, 2, 3, 4, 5, 6

## TSW-106-07-G-S_Strip
designator P?, comment TSW-106-07-G-S
Header SIL Male THP, 2.54mm Pitch; Manufacturer: Samtec; EDM-PN: CON12; Package: SIL6P-2.54; Text2: *; Text1: *; Value: TSW-106-07-G-S; SAAB PN: *; Part Number: TSW-106-07-G-S
footprint TSW-106-07-G-S (TSW-106-07-G-S 2.54mm)
pins: 1, 2, 3, 4, 5, 6

## TSW-106-08-F-S-RA
designator P?
Header SIL Male 2.54mm Rt Angle; Manufacturer: Samtec; Package: SIL6PR-2.54; EDM-PN: *; Text2: *; Text1: *; Part Number: TSW-106-08-F-S-RA; SAAB PN: *; Value: TSW-106-08-F-S-RA
footprint SIL6PR-2.54 (SIL Male Rt Angle THP Header, 2.54mm Pitch)
pins: 1, 2, 3, 4, 5, 6

## TSW-107-07-G-S
designator P?
Header SIL Male THP, 2.54mm Pitch; Manufacturer: Samtec; EDM-PN: CON12; Package: SIL7P-2.54; Text2: *; Text1: *; Value: TSW-107-07-G-S; SAAB PN: *; Part Number: TSW-107-07-G-S
footprint TSW-107-07-G-S (TSW-107-07-G-S 2.54mm)
pins: 1, 2, 3, 4, 5, 6, 7

## TSW-107-07-G-S_Strip
designator P?, comment TSW-107-07-G-S
Header SIL Male THP, 2.54mm Pitch; Manufacturer: Samtec; EDM-PN: CON12; Package: TSW-107-07-G-S; Text2: *; Text1: *; Value: TSW-107-07-G-S; SAAB PN: *; Part Number: TSW-107-07-G-S
footprint TSW-107-07-G-S (TSW-107-07-G-S 2.54mm)
pins: 1, 2, 3, 4, 5, 6, 7

## TSW-107-08-F-S-RA
designator P?
Header SIL Male 2.54mm Rt Angle; Manufacturer: Samtec; Package: TSW-107-08-F-S-RA; EDM-PN: *; Text2: *; Text1: *; Part Number: TSW-107-08-F-S-RA; SAAB PN: *; Value: TSW-107-08-F-S-RA
footprint SIL7PR-2.54 (SIL Male Rt Angle THP Header, 2.54mm Pitch)
pins: 1, 2, 3, 4, 5, 6, 7

## TSW-108-07-G-S
designator P?
Header SIL Male THP, 2.54mm Pitch; Manufacturer: Samtech; EDM-PN: CON12; Package: TSW-108-07-G-S; Text2: *; Text1: *; Value: TSW-108-07-G-S; SAAB PN: *; Part Number: TSW-108-07-G-S
footprint TSW-108-07-G-S (TSW-108-07-G-S 2.54mm)
pins: 1, 2, 3, 4, 5, 6, 7, 8

## TSW-108-07-G-S_Strip
designator P?, comment TSW-108-07-G-S
Header SIL Male THP, 2.54mm Pitch; Manufacturer: Samtech; EDM-PN: CON12; Package: TSW-108-07-G-S; Text2: *; Text1: *; Value: TSW-108-07-G-S; SAAB PN: *; Part Number: TSW-108-07-G-S
footprint TSW-108-07-G-S (TSW-108-07-G-S 2.54mm)
pins: 1, 2, 3, 4, 5, 6, 7, 8

## TSW-108-08-F-S-RA
designator P?
Header SIL Male 2.54mm Rt Angle; Manufacturer: Samtec; Package: SIL8PR-2.54; EDM-PN: *; Text2: *; Text1: *; Part Number: TSW-108-08-F-S-RA; SAAB PN: *; Value: TSW-108-08-F-S-RA
footprint SIL8PR-2.54 (SIL Male Rt Angle THP Header, 2.54mm Pitch)
pins: 1, 2, 3, 4, 5, 6, 7, 8

## TSW-109-07-G-S
designator P?
Header SIL Male THP, 2.54mm Pitch; Manufacturer: Various; EDM-PN: CON12; Package: SIL9P-2.54; Text2: *; Text1: *; Value: TSW-109-07-G-S; SAAB PN: *; Part Number: TSW-109-07-G-S
footprint SIL9P-2.54 (SIL Strip 2.54mm)
pins: 1, 2, 3, 4, 5, 6, 7, 8, 9

## TSW-109-07-G-S_Strip
designator P?, comment TSW-109-07-G-S
Header SIL Male THP, 2.54mm Pitch; Manufacturer: Various; EDM-PN: CON12; Package: SIL9P-2.54; Text2: *; Text1: *; Value: TSW-109-07-G-S; SAAB PN: *; Part Number: TSW-109-07-G-S
footprint SIL9P-2.54 (SIL Strip 2.54mm)
pins: 1, 2, 3, 4, 5, 6, 7, 8, 9

## TSW-109-08-F-S-RA
designator P?
Header SIL Male 2.54mm Rt Angle; Manufacturer: Samtec; Package: SIL9PR-2.54; EDM-PN: *; Text2: *; Text1: *; Part Number: TSW-109-08-F-S-RA; Value: TSW-109-08-F-S-RA; SAAB PN: *
footprint SIL9PR-2.54 (SIL Male Rt Angle THP Header, 2.54mm Pitch)
pins: 1, 2, 3, 4, 5, 6, 7, 8, 9

## TSW-110-07-G-S
designator P?
Header SIL Male THP, 2.54mm Pitch; Manufacturer: Samtec; EDM-PN: CON12; Package: SIL10P-2.54; Text2: *; Text1: *; Value: TSW-110-07-G-S; SAAB PN: *; Part Number: TSW-110-07-G-S
footprint SIL10P-2.54 (SIL Strip 2.54mm)
pins: 1, 2, 3, 4, 5, 6, 7, 8, 9, 10

## TSW-110-08-F-S-RA
designator P?
Header SIL Male 2.54mm Rt Angle; Manufacturer: Samtec; Package: SIL10PR-2.54; EDM-PN: *; Text2: *; Text1: *; Part Number: TSW-110-08-F-S-RA; Value: TSW-110-08-F-S-RA; SAAB PN: *
footprint SIL10PR-2.54 (SIL Male Rt Angle THP Header, 2.54mm Pitch)
pins: 1, 2, 3, 4, 5, 6, 7, 8, 9, 10

## TSW-110-14-G-S
designator P?
Header SIL Male THP, 2.54mm Pitch; Manufacturer: Samtec; Package: TSW-110-14-G-S; EDM-PN: *; Text2: *; Text1: *; Value: TSW-110-14-G-S; SAAB PN: *; Part Number: TSW-110-14-G-S
footprint TSW-110-14-G-S (SIL Strip 2.54mm)
pins: 1, 2, 3, 4, 5, 6, 7, 8, 9, 10

## TSW-110-14-G-S-Rev
designator P?
Header SIL Male THP, 2.54mm Pitch - Reverse mount; Manufacturer: Samtec; Package: TSW-110-14-G-S-Rev; EDM-PN: *; Text2: *; Text1: *; Part Number: TSW-110-14-G-S; Value: TSW-110-14-G-S-Rev; SAAB PN: *
footprint TSW-110-14-G-S-REV (SIL Strip 2.54mm - Reverse mount)
pins: 1, 2, 3, 4, 5, 6, 7, 8, 9, 10

## TSW-140-09-T-S-RA
designator P?
Header SIL Male THP, 2.54mm Pitch; Manufacturer: Samtec; EDM-PN: CON1383; SAAB PN: 1ANA01146AEA; Package: TSW-140-09-T-S-RA; Text2: *; Text1: *; Value: TSW-140-09-T-S-RA; Part Number: TSW-140-09-T-S-RA
footprint TSW-140-09-T-S-RA (TSW-140-09-T-S-RA 2.54mm)
pins: 1, 2, 3, 4, 5, 6, 7, 8, 9, 10, 11, 12, 13, 14, 15, 16, 17, 18, 19, 20, 21, 22, 23, 24, 25, 26, 27, 28, 29, 30, 31, 32, 33, 34, 35, 36, 37, 38, 39, 40